# Altium footprint library Connector.PcbLib: 231 footprints (part 1 of 15)
Each footprint in its own frame and in the unit in brackets; x right, y up, seen from the top. Pads: shape width x height; smd on the part's side, far side on the other; paste and mask are expansions set on the pad; w line width, h text height; cw(c..) or ccw(c..) is an arc to the next point about the centre after c.
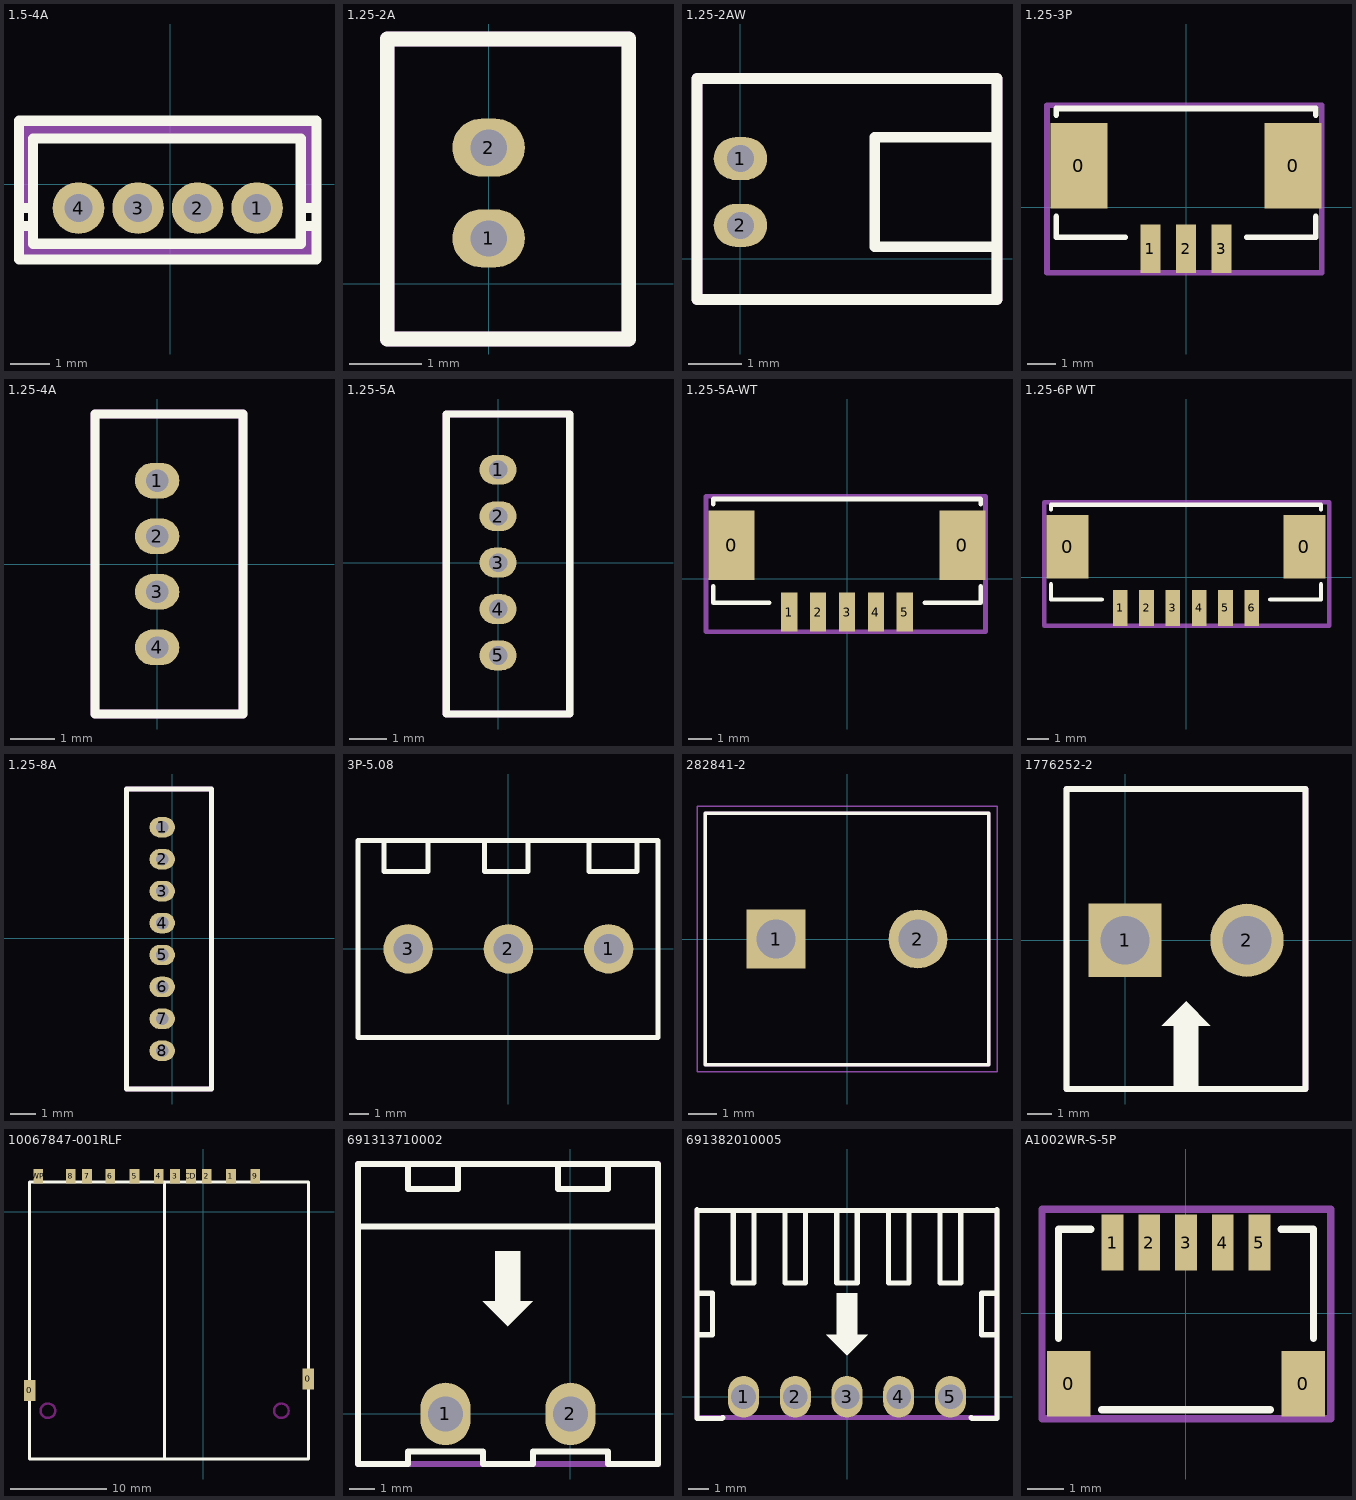
[diagram p0: the footprints below, top view; thin cyan lines are the x and y axes]

## 1.5-4A [mm]
pads (4):
  round 1.3 hole 0.7 paste+0 mask+0.05: 1(2.19,-0.601) 2(0.69,-0.601) 3(-0.81,-0.601) 4(-2.31,-0.601)
Top Overlay:
  lines w0.254: -3.81,-1.051 -3.51,-1.051 ; -3.81,-0.601 -3.51,-0.601 ; 3.29,-1.051 3.69,-1.051 ; 3.29,-0.601 3.69,-0.601 ; -3.81,-1.901 3.69,-1.901 3.69,1.599 -3.81,1.599 -3.81,-1.901 ; -3.46,-1.501 3.29,-1.501 3.29,1.149 -3.46,1.149 -3.46,-1.501
Mechanical 6:
  region: 3.29,-1.051 3.29,-1.501 -3.41,-1.501 -3.41,-1.151 -3.41,-1.051 -3.51,-1.051 -3.76,-1.051 -3.81,-1.051 -3.81,-1.901 3.69,-1.901 3.69,-1.051
  region: 3.69,-0.551 3.69,1.599 -3.81,1.599 -3.81,-0.601 -3.51,-0.601 -3.51,1.049 -3.46,1.099 3.34,1.099 3.34,-0.551 3.29,-0.601
Mechanical 15:
  region: 3.75,1.599 3.75,1.624 3.715,1.659 3.665,1.659 3.63,1.624 3.63,1.599 3.63,1.574 3.665,1.539 3.715,1.539 3.75,1.574
  region: -2.06,-0.601 -2.06,-0.551 -2.098,-0.459 -2.168,-0.389 -2.26,-0.351 -2.36,-0.351 -2.452,-0.389 -2.522,-0.459 -2.56,-0.551 -2.56,-0.601 -2.56,-0.651 -2.522,-0.743 -2.452,-0.813 -2.36,-0.851 -2.26,-0.851 -2.168,-0.813 -2.098,-0.743 -2.06,-0.651
  region: -0.56,-0.601 -0.56,-0.551 -0.598,-0.459 -0.668,-0.389 -0.76,-0.351 -0.86,-0.351 -0.952,-0.389 -1.022,-0.459 -1.06,-0.551 -1.06,-0.601 -1.06,-0.651 -1.022,-0.743 -0.952,-0.813 -0.86,-0.851 -0.76,-0.851 -0.668,-0.813 -0.598,-0.743 -0.56,-0.651
  region: 0.94,-0.601 0.94,-0.551 0.902,-0.459 0.832,-0.389 0.74,-0.351 0.64,-0.351 0.548,-0.389 0.478,-0.459 0.44,-0.551 0.44,-0.601 0.44,-0.651 0.478,-0.743 0.548,-0.813 0.64,-0.851 0.74,-0.851 0.832,-0.813 0.902,-0.743 0.94,-0.651
  region: 2.44,-0.601 2.44,-0.551 2.402,-0.459 2.332,-0.389 2.24,-0.351 2.14,-0.351 2.048,-0.389 1.978,-0.459 1.94,-0.551 1.94,-0.601 1.94,-0.651 1.978,-0.743 2.048,-0.813 2.14,-0.851 2.24,-0.851 2.332,-0.813 2.402,-0.743 2.44,-0.651
  lines w0.051: -3.81,-1.901 -3.81,1.599 3.69,1.599 3.69,-1.901 -3.81,-1.901

## 1.25-2A [mm]
pads (2):
  oval 1x0.8 hole 0.5: 1(0,0.625) 2(0,1.875)
Top Overlay:
  lines w0.2: -1.397,-0.762 1.93,-0.762 1.93,3.374 -1.397,3.374 -1.397,-0.762
Mechanical 13:
  lines w0.2: -1.397,-0.762 1.93,-0.762 1.93,3.374 -1.397,3.374 -1.397,-0.762
3D body "130612.stp": height 4.27, standoff -2.33, extent -1.393,-0.78 2.007,3.37

## 1.25-2AW [mm]
pads (2):
  oval 1x0.8 hole 0.5: 1(0,1.875) 2(0,0.625)
Top Overlay:
  lines w0.2: 4.799,0.225 2.515,0.225 2.515,2.275 4.799,2.275 ; -0.813,-0.762 -0.813,3.374 4.799,3.374 4.799,-0.762 -0.813,-0.762
Mechanical 13:
  lines w0.2: -0.813,-0.762 -0.813,3.374 4.799,3.374 4.799,-0.762 -0.813,-0.762
3D body "130612.stp": height 3.72, standoff 0.32, extent -1.801,-0.762 4.799,3.388

## 1.25-3P [mm]
pads (5):
  rect 2x3 smd: 0(-3.75,1.45) 0(3.75,1.45)
  rect 0.7x1.7 smd: 1(-1.25,-1.45) 2(0,-1.45) 3(1.25,-1.45)
Top Overlay:
  lines w0.2: -4.539,-0.325 -4.539,-1.05 -2.125,-1.05 ; -4.539,3.225 -4.539,3.452 4.539,3.452 4.539,3.225 ; 2.125,-1.05 4.539,-1.05 4.539,-0.325
Mechanical 13:
  lines w0.2: -4.862,-2.3 -4.862,3.568 4.75,3.568 4.75,-2.3 -4.862,-2.3
  text ".Designator" at -2.525,0.178 h2
3D body "JST - GH - SMD (R) - 3Pin - 1.25mm.stp": height 3.53, standoff 0, extent -4.539,-1.894 4.539,3.452

## 1.25-4A [mm]
pads (4):
  oval 1x0.8 hole 0.5: 1(0,1.875) 2(0,0.625) 3(0,-0.625) 4(0,-1.875)
Top Overlay:
  lines w0.2: -1.397,-3.373 -1.397,3.374 1.93,3.374 1.93,-3.373 -1.397,-3.373
Mechanical 13:
  lines w0.2: -1.397,-3.373 -1.397,3.374 1.93,3.374 1.93,-3.373 -1.397,-3.373
  text ".Designator" at -0.216,2.625 h1.5
3D body "JST - GH - Thru (V) - 4Pin - 1.25mm.stp": height 4.22, standoff -2.26, extent -1.397,-3.373 1.93,3.374

## 1.25-5A [mm]
pads (5):
  oval 1x0.8 hole 0.5: 1(0,2.5) 2(0,1.25) 3(0,0) 4(0,-1.25) 5(0,-2.5)
Top Overlay:
  lines w0.2: -1.397,-4.075 1.93,-4.075 1.93,3.999 -1.397,3.999 -1.397,-4.075
Mechanical 13:
  lines w0.2: -1.397,-4.075 1.93,-4.075 1.93,3.999 -1.397,3.999 -1.397,-4.075
  text ".Designator" at -0.216,3.25 h1.5
3D body "JST - GH - Thru (V) - 5Pin - 1.25mm.stp": height 1.76, standoff -4.72, extent -1.397,-4.037 1.93,3.96

## 1.25-5A-WT [mm]
pads (7):
  rect 2x3 smd: 0(-5,1.45) 0(5,1.45)
  rect 0.7x1.7 smd: 1(-2.5,-1.45) 2(-1.25,-1.45) 3(0,-1.45) 4(1.25,-1.45) 5(2.5,-1.45)
Top Overlay:
  lines w0.2: -5.789,-0.325 -5.789,-1.05 -3.375,-1.05 ; -5.789,3.225 -5.789,3.452 5.789,3.452 5.789,3.225 ; 3.375,-1.05 5.789,-1.05 5.789,-0.325
Mechanical 13:
  lines w0.2: -6.112,-2.3 -6.112,3.568 6,3.568 6,-2.3 -6.112,-2.3
  text ".Designator" at -3.775,0.178 h2
3D body "JST - GH - SMD (R) - 5Pin - 1.25mm.stp": height 3.53, standoff 0, extent -5.789,-1.894 5.789,3.452

## 1.25-6P WT [mm]
pads (8):
  rect 2x3 smd: 0(-5.625,1.45) 0(5.625,1.45)
  rect 0.7x1.7 smd: 1(-3.125,-1.45) 2(-1.875,-1.45) 3(-0.625,-1.45) 4(0.625,-1.45) 5(1.875,-1.45) 6(3.125,-1.45)
Top Overlay:
  lines w0.2: -6.414,-0.325 -6.414,-1.05 -4,-1.05 ; -6.414,3.225 -6.414,3.452 6.414,3.452 6.414,3.225 ; 4,-1.05 6.414,-1.05 6.414,-0.325
Mechanical 13:
  lines w0.2: -6.737,-2.3 -6.737,3.568 6.8,3.568 6.8,-2.3 -6.737,-2.3
  text ".Designator" at -4.4,0.178 h2
3D body "JST - GH - SMD (R) - 6Pin - 1.25mm.stp": height 3.53, standoff 0, extent -6.414,-1.894 6.414,3.452

## 1.25-8A [mm]
pads (8):
  oval 1x0.8 hole 0.5: 1(-0.4,4.35) 2(-0.4,3.1) 3(-0.4,1.85) 4(-0.4,0.6) 5(-0.4,-0.65) 6(-0.4,-1.9) 7(-0.4,-3.15) 8(-0.4,-4.4)
Top Overlay:
  lines w0.2: -1.797,-5.898 1.53,-5.898 1.53,5.849 -1.797,5.849 -1.797,-5.898
Mechanical 13:
  lines w0.2: -1.797,-5.898 1.53,-5.898 1.53,5.849 -1.797,5.849 -1.797,-5.898
  text ".Designator" at 0.384,3.5 h1.5
3D body "JST - GH - Thru (V) - 4Pin - 1.25mm.stp": height 4.22, standoff -2.26, extent -1.797,-0.898 1.53,5.849
3D body "JST - GH - Thru (V) - 4Pin - 1.25mm.stp": height 4.22, standoff -2.26, extent -1.797,-5.898 1.53,0.849

## 3P-5.08 [mm]
pads (3):
  round 2.5 hole 1.5: 1(5.08,0) 2(0,0) 3(-5.08,0)
Top Overlay:
  lines w0.254: -6.3,5.475 -6.3,3.925 -4.075,3.925 -4.075,5.475 ; -1.22,5.475 -1.22,3.925 1.005,3.925 1.005,5.475 ; 4.08,5.5 4.08,3.925 6.505,3.925 6.505,5.425 ; -7.62,-4.5 7.58,-4.5 7.58,5.5 -7.62,5.5 -7.62,-4.5
Mechanical 13:
  text ".Designator" at 3.5,2.716 h1.5
3D body "User Library-TER-KF128-3P.step": height 14.35, standoff -4.95, extent -7.665,-4.9 8.175,5.6

## 282841-2 [mm]
pads (2):
  rect 2.1x2.1 / inner round 2.1 / far side rect 2.1x2.1 hole 1.4: 1(-2.54,0)
  round 2.1 hole 1.4: 2(2.54,0)
Top Overlay:
  lines w0.127: -5.08,-4.5 5.08,-4.5 5.08,4.5 -5.08,4.5 -5.08,-4.5
Mechanical 13:
  circle w0.4: c-2.54,0 r0.2
  lines w0.127: -5.08,-4.5 5.08,-4.5 5.08,4.5 -5.08,4.5 -5.08,-4.5
Mechanical 15:
  lines w0.05: -5.37,-4.75 -5.37,4.75 5.37,4.75 5.37,-4.75 -5.37,-4.75
3D body "step_temp.STEP": height 15.2, standoff -3.5, extent -5.076,-4.445 5.584,4.555

## 1776252-2 [mm]
pads (2):
  rect 3x3 hole 2: 1(0,0)
  round 3 hole 2: 2(5,0)
Top Overlay:
  region: 2,-6 2,-3.5 1.5,-3.5 2.5,-2.5 3.5,-3.5 3,-3.5 3,-6
  lines w0.25: -2.4,-6.1 -2.4,6.2 7.4,6.2 7.4,-6.1 -2.4,-6.1
Mechanical 13:
  lines w0.25: -2.4,-6.1 -2.4,6.2 7.4,6.2 7.4,-6.1 -2.4,-6.1
  text ".Designator" at -0.3,2 h2
Mechanical 15:
  lines w0.25: -2.4,-6.1 7.4,-6.1 7.4,6.2 -2.4,6.2 -2.4,-6.1
  text ".Comment" at -0.3,2 h2
3D body "c-1776252-2-o-3d.stp": height 12, standoff -4.3, extent -2.5,-6.3 7.5,6.2

## 10067847-001RLF [mm]
pads (13):
  rect 1.2x2.2 smd: 0(-17.975,-18.55) 0(10.925,-17.35)
  rect 1x1.5 smd: 1(2.9,3.65) 2(0.4,3.65) 3(-2.9,3.65) 4(-4.6,3.65) 5(-7.1,3.65) 6(-9.6,3.65) 7(-12.025,3.65) 8(-13.725,3.65) 9(5.4,3.65) CD(-1.25,3.65) WP(-17.075,3.65)
Top Overlay:
  lines w0.3: -3.975,-25.629 -3.975,3.05 ; -17.975,-25.65 -17.975,3.05 10.925,3.05 10.925,-25.65 -17.975,-25.65
Keep-Out Layer:
  circle w0.254: c8.125,-20.65 r0.75
  circle w0.254: c-16.075,-20.65 r0.75
Mechanical 13:
  lines w0.2: -17.975,-25.65 -17.975,3.05 10.925,3.05 10.925,-25.65 -17.975,-25.65
  lines w0.3: -3.975,-25.629 -3.975,3.05
  text ".Designator" at -4.8,-0.547 h2

## 691313710002 [mm]
pads (2):
  oval 2x2.5 hole 1.4: 1(-5,0) 2(0,0)
Top Overlay:
  region: -3,6.5 -3,4.5 -3.5,4.5 -2.5,3.5 -1.5,4.5 -2,4.5 -2,6.5
  lines w0.254: -8.5,7.5 3.5,7.5 ; -6.5,10 -6.5,9 -4.5,9 -4.5,10 ; -0.5,10 -0.5,9 1.5,9 1.5,10 ; -6.5,-2 -6.5,-1.5 -3.5,-1.5 -3.5,-2 -1.5,-2 -1.5,-1.5 1.5,-1.5 1.5,-2 3.5,-2 ; -6.5,-2 -6.5,-2 ; -6.5,-2 -8.5,-2 -8.5,10 3.5,10 ; 3.5,-2 3.5,10 ; 3.5,-2 3.5,-2 ; 3.5,10 3.5,10 ; 3.5,10 3.5,10
Mechanical 13:
  lines w0.254: -8.5,10 -8.5,10 ; -8.5,10 3.5,10 ; -8.5,10 -8.5,-2 3.5,-2 3.5,10 ; 3.5,10 3.5,10
  text ".Designator" at -2,-2 h2
Mechanical 15:
  lines w0.254: -8.5,-2 3.5,-2 3.5,10 ; -8.5,-2 -8.5,-2 ; -8.5,-2 -8.5,10 ; -8.5,10 -8.5,10 ; -8.5,10 3.5,10 ; 3.5,10 3.5,10
  text ".Comment" at -2,-2 h2
3D body "691313710002 (rev1).stp": height 8.25, standoff -3.75, extent -8.5,-2 3.5,10

## 691382010005 [mm]
pads (5):
  oval 1.5x2 hole 1.2: 1(-5,0) 2(-2.5,0) 3(0,0) 4(2.5,0) 5(5,0)
Top Overlay:
  region: -0.5,5 -0.5,3 -1,3 0,2 1,3 0.5,3 0.5,5
  lines w0.254: -7.25,3 -6.5,3 -6.5,5 -7.25,5 ; -7.25,9 7.2,9 7.25,9.05 7.25,-1.05 6.05,-1.05 6,-1 ; -7.25,9.05 -7.25,-1.05 -6.05,-1.05 -6,-1 ; -5.5,9 -5.5,5.5 -4.5,5.5 -4.5,9 ; -3,9 -3,5.5 -2,5.5 -2,9 ; -0.5,9 -0.5,5.5 0.5,5.5 0.5,9 ; 2,9 2,5.5 3,5.5 3,9 ; 4.5,9 4.5,5.5 5.5,5.5 5.5,9 ; 7.25,3 6.5,3 6.5,5 7.25,5
Mechanical 13:
  lines w0.254: -7.25,-1 -7.25,9 7.25,9 7.25,-1 -7.25,-1
  text ".Designator" at -7,3 h3
Mechanical 15:
  lines w0.254: -7.25,-1 -7.25,9 7.25,9 7.25,-1.05 7.2,-1 -7.25,-1
  text ".Comment" at -7,3 h3
3D body "691382010005 (rev1).stp": height 8.05, standoff -3.55, extent -7.25,-1.05 7.25,9.05

## A1002WR-S-5P [mm]
pads (7):
  rect 1.2x1.8 smd: 0(-3.217,-1.937) 0(3.217,-1.937)
  rect 0.6x1.55 smd: 1(-2.017,1.938) 2(-1.009,1.938) 3(0,1.938) 4(1.009,1.938) 5(2.017,1.938)
Top Overlay:
  lines w0.2: -3.5,-0.7 -3.5,2.3 -2.617,2.3 ; -2.317,-2.65 2.317,-2.65 ; 2.617,2.3 3.5,2.3 3.5,-0.7
Mechanical 13:
  lines w0.2: -3.95,-2.9 -3.95,2.85 3.975,2.85 3.975,-2.9 -3.95,-2.9
  text ".Designator" at -2.575,-0.391 h1.5
3D body "jst_1mm.step": height 2.9, standoff 0, extent -3.5,-2.65 3.5,2.3